# Altium footprint library SWLIB(150721).PcbLib: 348 footprints (part 12 of 22)
Each footprint in its own frame and in the unit in brackets; x right, y up, seen from the top. Pads: shape width x height; smd on the part's side, far side on the other; paste and mask are expansions set on the pad; w line width, h text height; cw(c..) or ccw(c..) is an arc to the next point about the centre after c.
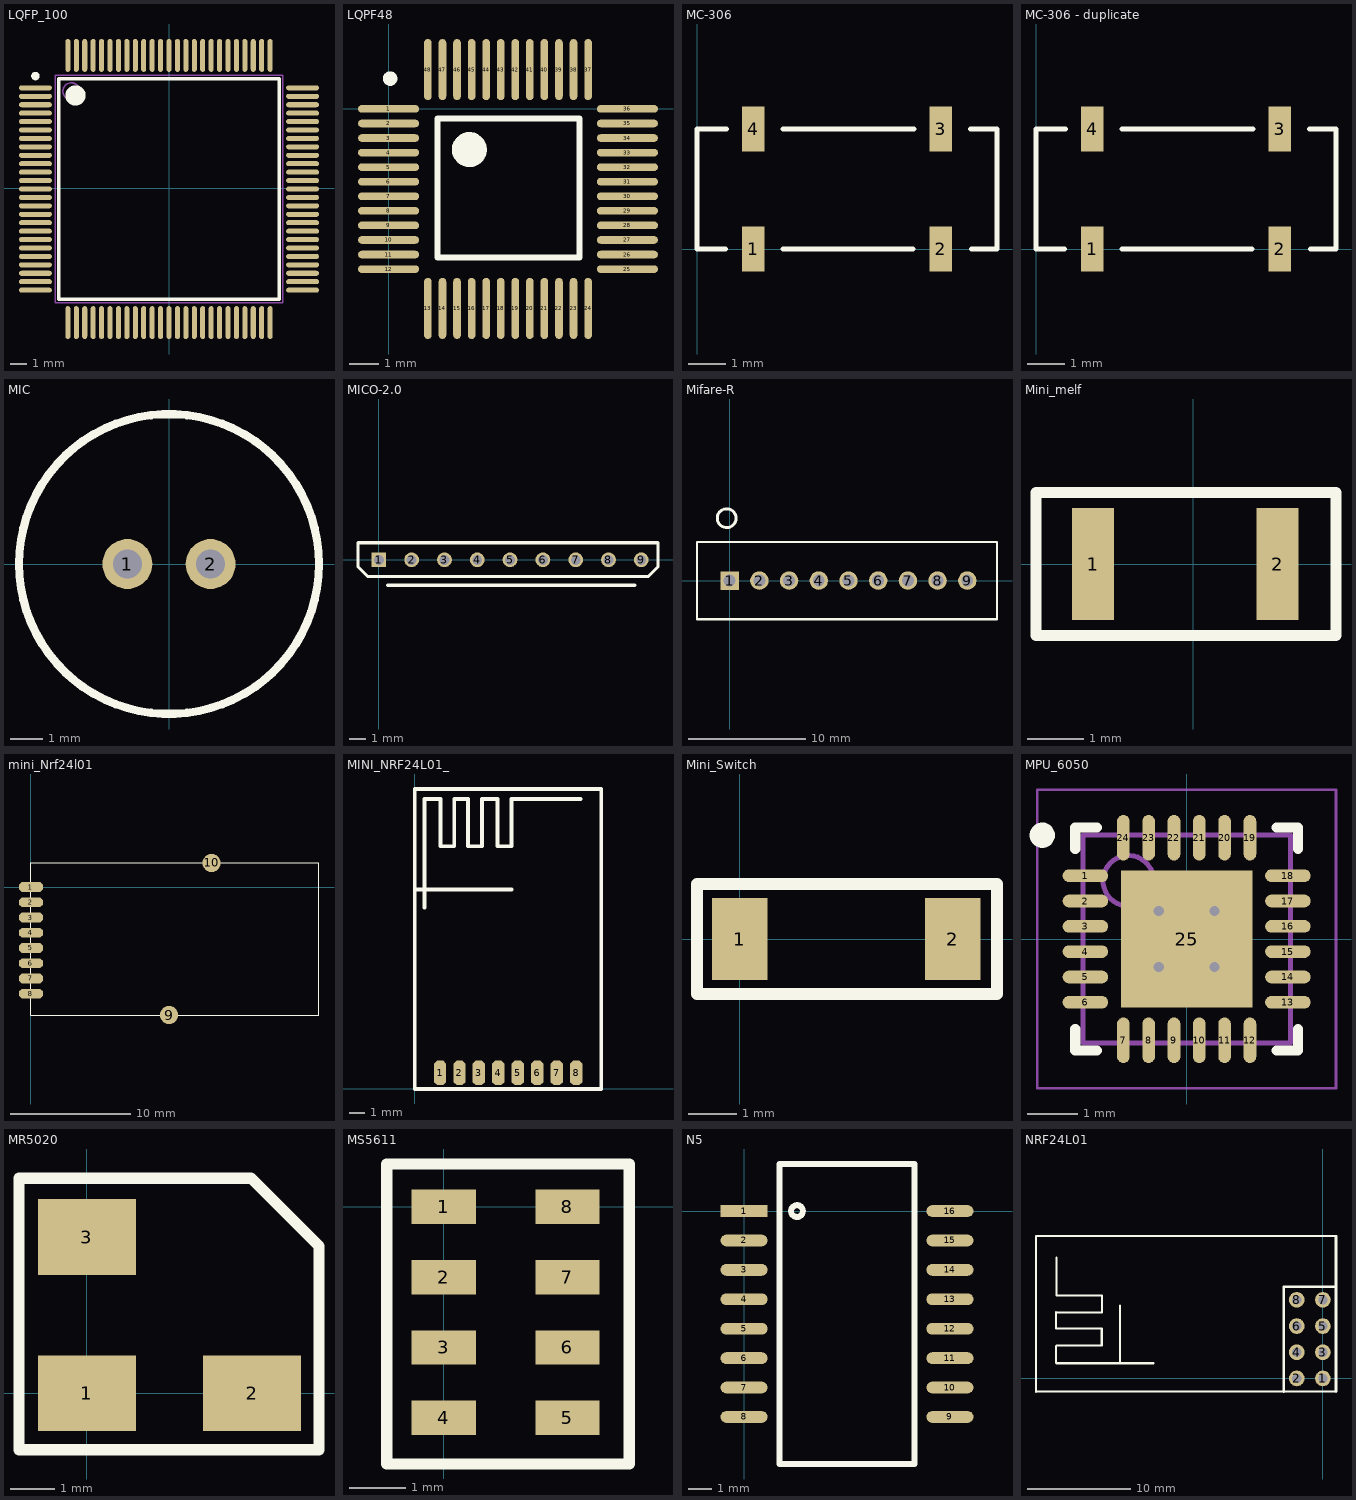
[diagram p11: the footprints below, top view; thin cyan lines are the x and y axes]

## LQFP_100 [mm]
height 5.7
pads (100):
  oval 1.95x0.3 smd: 1(-7.925,5.949) 2(-7.925,5.449) 3(-7.925,4.949) 4(-7.925,4.449) 5(-7.925,3.949) 6(-7.925,3.449) 7(-7.925,2.949) 8(-7.925,2.449) 9(-7.925,1.949) 10(-7.925,1.449) 11(-7.925,0.949) 12(-7.925,0.449) 13(-7.925,-0.051) 14(-7.925,-0.551) 15(-7.925,-1.051) 16(-7.925,-1.551) 17(-7.925,-2.051) 18(-7.925,-2.551) 19(-7.925,-3.051) 20(-7.925,-3.551) 21(-7.925,-4.051) 22(-7.925,-4.551) 23(-7.925,-5.051) 24(-7.925,-5.551) 25(-7.925,-6.051) 51(7.925,-6.051) 52(7.925,-5.551) 53(7.925,-5.051) 54(7.925,-4.551) 55(7.925,-4.051) 56(7.925,-3.551) 57(7.925,-3.051) 58(7.925,-2.551) 59(7.925,-2.051) 60(7.925,-1.551) 61(7.925,-1.051) 62(7.925,-0.551) 63(7.925,-0.051) 64(7.925,0.449) 65(7.925,0.949) 66(7.925,1.449) 67(7.925,1.949) 68(7.925,2.449) 69(7.925,2.949) 70(7.925,3.449) 71(7.925,3.949) 72(7.925,4.449) 73(7.925,4.949) 74(7.925,5.449) 75(7.925,5.949)
  oval 0.3x1.95 smd: 26(-6,-7.976) 27(-5.5,-7.976) 28(-5,-7.976) 29(-4.5,-7.976) 30(-4,-7.976) 31(-3.5,-7.976) 32(-3,-7.976) 33(-2.5,-7.976) 34(-2,-7.976) 35(-1.5,-7.976) 36(-1,-7.976) 37(-0.5,-7.976) 38(0,-7.976) 39(0.5,-7.976) 40(1,-7.976) 41(1.5,-7.976) 42(2,-7.976) 43(2.5,-7.976) 44(3,-7.976) 45(3.5,-7.976) 46(4,-7.976) 47(4.5,-7.976) 48(5,-7.976) 49(5.5,-7.976) 50(6,-7.976) 76(6,7.874) 77(5.5,7.874) 78(5,7.874) 79(4.5,7.874) 80(4,7.874) 81(3.5,7.874) 82(3,7.874) 83(2.5,7.874) 84(2,7.874) 85(1.5,7.874) 86(1,7.874) 87(0.5,7.874) 88(0,7.874) 89(-0.5,7.874) 90(-1,7.874) 91(-1.5,7.874) 92(-2,7.874) 93(-2.5,7.874) 94(-3,7.874) 95(-3.5,7.874) 96(-4,7.874) 97(-4.5,7.874) 98(-5,7.874) 99(-5.5,7.874) 100(-6,7.874)
Top Overlay:
  circle w0.25: c-7.925,6.649 r0.125
  circle w0.6: c-5.55,5.499 r0.3
  lines w0.2: -6.55,-6.601 6.55,-6.601 6.55,6.499 -6.55,6.499 -6.55,0.66 -6.55,-6.601
Mechanical 13:
  circle w0.1: c-5.8,5.749 r0.5
  lines w0.1: -6.75,-6.801 -6.75,6.699 6.75,6.699 6.75,-6.801 -6.75,-6.801
3D body "User Library-LQFP100_Grid_0_5.STEP": height 1.6, standoff 0, extent -8,-8 8,8

## LQPF48 [mm]
pads (48):
  oval 2.1x0.26 smd: 1(0,0) 2(0,-0.5) 3(0,-1) 4(0,-1.5) 5(0,-2) 6(0,-2.5) 7(0,-3) 8(0,-3.5) 9(0,-4) 10(0,-4.5) 11(0,-5) 12(0,-5.5) 25(8.2,-5.5) 26(8.2,-5) 27(8.2,-4.5) 28(8.2,-4) 29(8.2,-3.5) 30(8.2,-3) 31(8.2,-2.5) 32(8.2,-2) 33(8.2,-1.5) 34(8.2,-1) 35(8.2,-0.5) 36(8.2,0)
  oval 0.26x2.1 smd: 13(1.35,-6.85) 14(1.85,-6.85) 15(2.35,-6.85) 16(2.85,-6.85) 17(3.35,-6.85) 18(3.85,-6.85) 19(4.35,-6.85) 20(4.85,-6.85) 21(5.35,-6.85) 22(5.85,-6.85) 23(6.35,-6.85) 24(6.85,-6.85) 37(6.85,1.35) 38(6.35,1.35) 39(5.85,1.35) 40(5.35,1.35) 41(4.85,1.35) 42(4.35,1.35) 43(3.85,1.35) 44(3.35,1.35) 45(2.85,1.35) 46(2.35,1.35) 47(1.85,1.35) 48(1.35,1.35)
Top Overlay:
  circle w0.25: c0.053,1.041 r0.125
  circle w0.6: c2.773,-1.397 r0.3
  lines w0.2: 1.676,-5.105 1.676,-0.33 6.553,-0.33 6.553,-5.105 1.676,-5.105
3D body: height 2, standoff 0.2, extent 0.584,-6.274 7.595,0.762

## MC-306 [mm]
pads (4):
  rect 0.6x1.2 smd: 1(1.499,0) 2(6.502,0) 3(6.502,3.2) 4(1.499,3.2)
Top Overlay:
  lines w0.127: 0.762,0 0,0 0,3.2 0.787,3.2 ; 2.286,0 5.766,0 ; 2.286,3.2 5.791,3.2 ; 7.29,3.2 8.001,3.2 ; 7.315,0 8.001,0 ; 8,0 8,3.2

## MC-306 - duplicate [mm]
pads (4):
  rect 0.6x1.2 smd: 1(1.499,0) 2(6.502,0) 3(6.502,3.2) 4(1.499,3.2)
Top Overlay:
  lines w0.127: 0.762,0 0,0 0,3.2 0.787,3.2 ; 2.286,0 5.766,0 ; 2.286,3.2 5.791,3.2 ; 7.29,3.2 8.001,3.2 ; 7.315,0 8.001,0 ; 8,0 8,3.2

## MIC [mil] "9*7"
pads (2):
  round 60 hole 35: 1(-50,0) 2(50,0)
Top Overlay:
  circle w10: c0,0 r180.28

## MICO-2.0 [mm]
pads (9):
  rect 0.9x0.9 hole 0.6: 1(0,0)
  round 0.9 hole 0.6: 2(2,0) 3(4,0) 4(6,0) 5(8,0) 6(10,0) 7(12,0) 8(14,0) 9(16,0)
Top Overlay:
  lines w0.2: 0.533,-1.549 15.621,-1.549 ; -1.27,-0.432 -0.686,-1.016 16.434,-1.016 17.018,-0.432 17.018,1.041 -1.27,1.041 -1.27,-0.432

## Mifare-R [mil]
pads (9):
  rect 62x62 hole 40: 1(0,0)
  round 62 hole 40: 2(100,0) 3(200,0) 4(300,0) 5(400,0) 6(500,0) 7(600,0) 8(700,0) 9(800,0)
Top Overlay:
  circle w10: c-10,210 r31.62
  lines w8: -110,-130 900,-130 900,130 -110,130 -110,-130

## Mini_melf [mm]
pads (2):
  rect 0.75x2 smd: 1(-1.778,0) 2(1.5,0)
Top Overlay:
  lines w0.2: -2.794,-1.27 -2.794,1.27 2.54,1.27 2.54,-1.27 -2.794,-1.27

## mini_Nrf24l01 [mm] "表贴"
pads (10):
  oct 2x0.8 smd: 1(0,0) 2(0,-1.27) 3(0,-2.54) 4(0,-3.81) 5(0,-5.08) 6(0,-6.35) 7(0,-7.62) 8(0,-8.89)
  round 1.524 smd: 9(11.506,-10.668) 10(15.05,2.007)
Top Overlay:
  lines w0.1: 0,-10.668 23.749,-10.668 24.003,-10.668 24.003,2.032 0,2.032 0,-10.668

## MINI_NRF24L01_ [mm] "1.27mm"
height 1.7
pads (8):
  oct 0.8x1.6 smd: 1(1.626,1.041) 2(2.878,1.041) 3(4.13,1.041) 4(5.382,1.041) 5(6.633,1.041) 6(7.885,1.041) 7(9.137,1.041) 8(10.389,1.041)
Top Overlay:
  lines w0.254: 0.127,12.827 6.223,12.827 ; 0.635,11.684 0.635,12.827 0.635,18.669 1.651,18.669 1.651,15.621 2.54,15.621 2.54,18.669 3.429,18.669 3.429,15.621 4.318,15.621 4.318,18.669 5.334,18.669 5.334,15.621 6.223,15.621 6.223,18.669 10.668,18.669 ; 0,0 0,19.304 12,19.304 12,0 0,0

## Mini_Switch [mm]
pads (2):
  rect 1.15x1.7 smd: 1(0,0) 2(4.42,0)
Top Overlay:
  lines w0.254: -0.889,-1.143 5.334,-1.143 5.334,1.143 -0.889,1.143 -0.889,-1.143

## MPU_6050 [mm] "QFN, 24-Leads, Body 4.00x4.00mm, Pitch 0.50mm, Thermal Pad 2.60x2.70mm, IPC Low Density"
height 0.9
pads (25):
  oval 0.9x0.25 smd: 1(-2,1.25) 2(-2,0.75) 3(-2,0.25) 4(-2,-0.25) 5(-2,-0.75) 6(-2,-1.25) 13(2,-1.25) 14(2,-0.75) 15(2,-0.25) 16(2,0.25) 17(2,0.75) 18(2,1.25)
  oval 0.25x0.9 smd: 7(-1.25,-2) 8(-0.75,-2) 9(-0.25,-2) 10(0.25,-2) 11(0.75,-2) 12(1.25,-2) 19(1.25,2) 20(0.75,2) 21(0.25,2) 22(-0.25,2) 23(-0.75,2) 24(-1.25,2)
  rect 2.6x2.7 smd: 25(0,0)
via -0.55,0.55 diameter 0.5 hole 0.2
via -0.55,-0.55 diameter 0.5 hole 0.2
via 0.55,-0.55 diameter 0.5 hole 0.2
via 0.55,0.55 diameter 0.5 hole 0.2
Top Overlay:
  circle w0.25: c-2.85,2.05 r0.125
  lines w0.2: -2.2,-1.775 -2.2,-2.2 -1.775,-2.2 ; -2.2,1.775 -2.2,2.2 -1.775,2.2 ; 1.775,-2.2 2.2,-2.2 2.2,-1.775 ; 1.775,2.2 2.2,2.2 2.2,1.775
Mechanical 13:
  circle w0.1: c-1.15,1.15 r0.5
  lines w0.1: -2.05,-2.05 2.05,-2.05 2.05,2.05 -2.05,2.05 -2.05,-2.05
Mechanical 15:
  lines w0.05: -2.95,-2.95 2.95,-2.95 2.95,2.95 -2.95,2.95 -2.95,-2.95
  lines w0.1: -0.5,0 0.5,0 ; 0,-0.5 0,0.5
3D body: height 0.9, standoff 0.02, extent -2.05,-2.05 2.05,2.05

## MR5020 [mm]
pads (3):
  rect 2.2x1.7 smd: 1(0,0) 2(3.708,0) 3(0,3.505)
Top Overlay:
  lines w0.254: -1.524,-1.27 5.207,-1.27 5.207,3.302 3.683,4.826 -1.27,4.826 -1.524,4.826 -1.524,-1.27

## MS5611 [mil]
pads (8):
  rect 45x24 smd: 1(0,0) 2(0,-49.21) 3(0,-98.43) 4(0,-147.64) 5(86.61,-147.64) 6(86.61,-98.43) 7(86.61,-49.21) 8(86.61,0)
Top Overlay:
  lines w8: -40,-180 130,-180 130,30 -40,30 -40,-180

## N5 [mil]
pads (16):
  rect 80x20 smd: 1(0,0)
  oval 80x20 smd: 2(0,-50) 3(0,-100) 4(0,-150) 5(0,-200) 6(0,-250) 7(0,-300) 8(0,-350) 9(350,-350) 10(350,-300) 11(350,-250) 12(350,-200) 13(350,-150) 14(350,-100) 15(350,-50) 16(350,0)
Top Overlay:
  circle w10: c90,0 r10
  lines w10: 60,-430 290,-430 290,80 60,80 60,-430

## NRF24L01 [mil] "2.54mm"
pads (8):
  round 60 hole 35: 1(0,0) 2(-100,0) 3(0,100) 4(-100,100) 5(0,200) 6(-100,200) 7(0,300) 8(-100,300)
Top Overlay:
  lines w8: -1017,461 -1017,375 -1017,316 -843,316 -843,252 -1017,252 -1019,254 -1019,192 -1017,190 -844,190 -844,126 -1016,126 -1019,123 -1019,60 -1017,58 -646,58 ; -775,60 -775,279 ; 50,-50 -1094,-50 -1095,-51 -1095,542 -1094,543 50,543
  lines w10: -150,-50 -150,350 50,350 ; 50,-50 50,543